# Altium footprint library 6-Connectors-2.PcbLib: 57 footprints (part 3 of 7)
Each footprint in its own frame and in the unit in brackets; x right, y up, seen from the top. Pads: shape width x height; smd on the part's side, far side on the other; paste and mask are expansions set on the pad; w line width, h text height; cw(c..) or ccw(c..) is an arc to the next point about the centre after c.
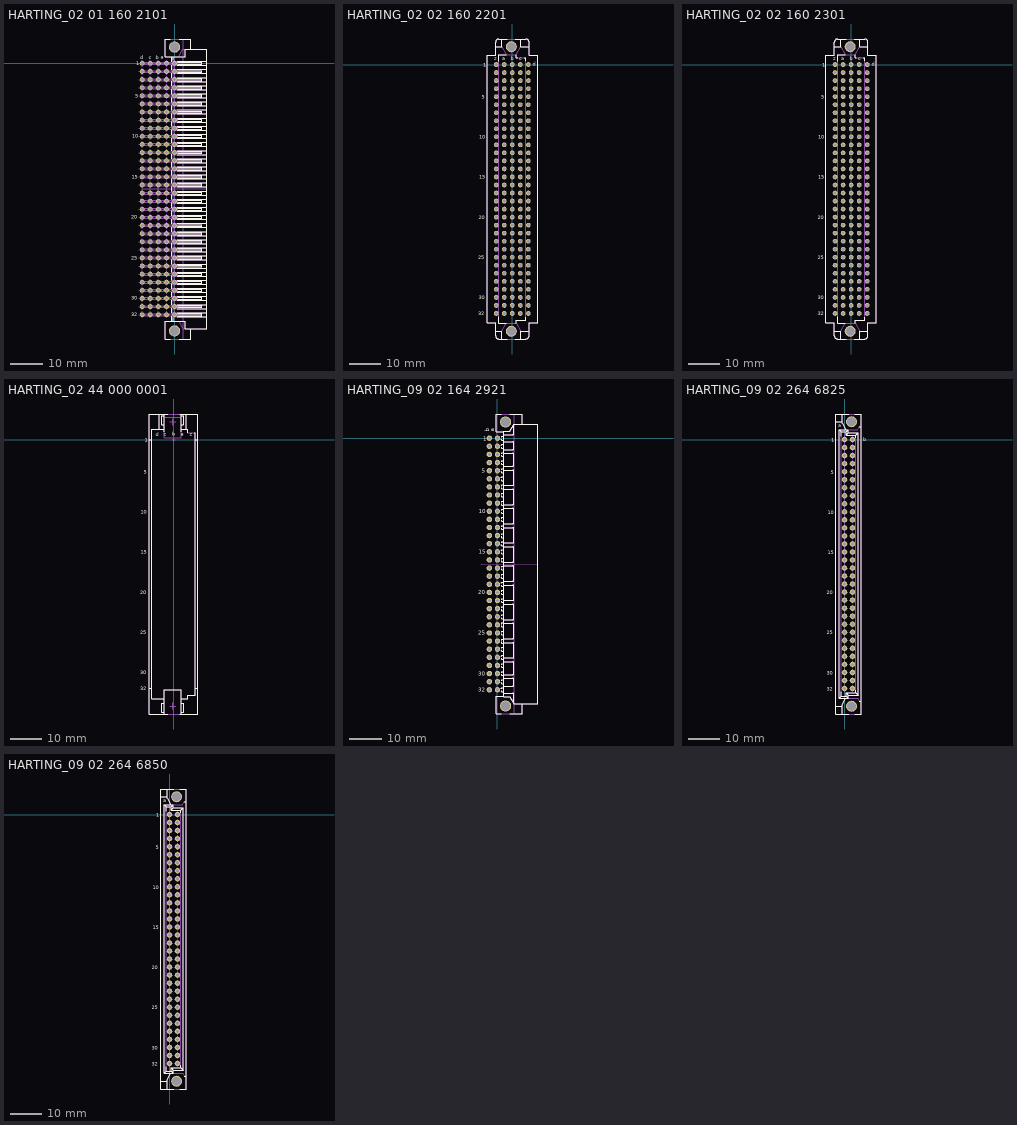
[diagram p2: the footprints below, top view; thin cyan lines are the x and y axes]

## HARTING_02 01 160 2101 [mm] "PCB connector, DIN 41612, har-bus 64, 160 poles, Angled solder pins, 3.0 mm, Male contacts, Four first mating contacts, Performance level 2 as per IEC 60603-2, Row pitch: 2.54 mm, Without fixing"
height 11.1
pads (162):
  round 1.5 hole 1: a1(-2.54,0) a2(-2.54,-2.54) a3(-2.54,-5.08) a4(-2.54,-7.62) a5(-2.54,-10.16) a6(-2.54,-12.7) a7(-2.54,-15.24) a8(-2.54,-17.78) a9(-2.54,-20.32) a10(-2.54,-22.86) a11(-2.54,-25.4) a12(-2.54,-27.94) a13(-2.54,-30.48) a14(-2.54,-33.02) a15(-2.54,-35.56) a16(-2.54,-38.1) a17(-2.54,-40.64) a18(-2.54,-43.18) a19(-2.54,-45.72) a20(-2.54,-48.26) a21(-2.54,-50.8) a22(-2.54,-53.34) a23(-2.54,-55.88) a24(-2.54,-58.42) a25(-2.54,-60.96) a26(-2.54,-63.5) a27(-2.54,-66.04) a28(-2.54,-68.58) a29(-2.54,-71.12) a30(-2.54,-73.66) a31(-2.54,-76.2) a32(-2.54,-78.74) b1(-5.08,0) b2(-5.08,-2.54) b3(-5.08,-5.08) b4(-5.08,-7.62) b5(-5.08,-10.16) b6(-5.08,-12.7) b7(-5.08,-15.24) b8(-5.08,-17.78) b9(-5.08,-20.32) b10(-5.08,-22.86) b11(-5.08,-25.4) b12(-5.08,-27.94) b13(-5.08,-30.48) b14(-5.08,-33.02) b15(-5.08,-35.56) b16(-5.08,-38.1) b17(-5.08,-40.64) b18(-5.08,-43.18) b19(-5.08,-45.72) b20(-5.08,-48.26) b21(-5.08,-50.8) b22(-5.08,-53.34) b23(-5.08,-55.88) b24(-5.08,-58.42) b25(-5.08,-60.96) b26(-5.08,-63.5) b27(-5.08,-66.04) b28(-5.08,-68.58) b29(-5.08,-71.12) b30(-5.08,-73.66) b31(-5.08,-76.2) b32(-5.08,-78.74) c1(-7.62,0) c2(-7.62,-2.54) c3(-7.62,-5.08) c4(-7.62,-7.62) c5(-7.62,-10.16) c6(-7.62,-12.7) c7(-7.62,-15.24) c8(-7.62,-17.78) c9(-7.62,-20.32) c10(-7.62,-22.86) c11(-7.62,-25.4) c12(-7.62,-27.94) c13(-7.62,-30.48) c14(-7.62,-33.02) c15(-7.62,-35.56) c16(-7.62,-38.1) c17(-7.62,-40.64) c18(-7.62,-43.18) c19(-7.62,-45.72) c20(-7.62,-48.26) c21(-7.62,-50.8) c22(-7.62,-53.34) c23(-7.62,-55.88) c24(-7.62,-58.42) c25(-7.62,-60.96) c26(-7.62,-63.5) c27(-7.62,-66.04) c28(-7.62,-68.58) c29(-7.62,-71.12) c30(-7.62,-73.66) c31(-7.62,-76.2) c32(-7.62,-78.74) d1(-10.16,0) d2(-10.16,-2.54) d3(-10.16,-5.08) d4(-10.16,-7.62) d5(-10.16,-10.16) d6(-10.16,-12.7) d7(-10.16,-15.24) d8(-10.16,-17.78) d9(-10.16,-20.32) d10(-10.16,-22.86) d11(-10.16,-25.4) d12(-10.16,-27.94) d13(-10.16,-30.48) d14(-10.16,-33.02) d15(-10.16,-35.56) d16(-10.16,-38.1) d17(-10.16,-40.64) d18(-10.16,-43.18) d19(-10.16,-45.72) d20(-10.16,-48.26) d21(-10.16,-50.8) d22(-10.16,-53.34) d23(-10.16,-55.88) d24(-10.16,-58.42) d25(-10.16,-60.96) d26(-10.16,-63.5) d27(-10.16,-66.04) d28(-10.16,-68.58) d29(-10.16,-71.12) d30(-10.16,-73.66) d31(-10.16,-76.2) d32(-10.16,-78.74) z1(0,0) z2(0,-2.54) z3(0,-5.08) z4(0,-7.62) z5(0,-10.16) z6(0,-12.7) z7(0,-15.24) z8(0,-17.78) z9(0,-20.32) z10(0,-22.86) z11(0,-25.4) z12(0,-27.94) z13(0,-30.48) z14(0,-33.02) z15(0,-35.56) z16(0,-38.1) z17(0,-40.64) z18(0,-43.18) z19(0,-45.72) z20(0,-48.26) z21(0,-50.8) z22(0,-53.34) z23(0,-55.88) z24(0,-58.42) z25(0,-60.96) z26(0,-63.5) z27(0,-66.04) z28(0,-68.58) z29(0,-71.12) z30(0,-73.66) z31(0,-76.2) z32(0,-78.74)
  round 3.5 / inner round 3.5 / far side round 5.1 hole 2.8: MTG1(0,5.08) MTG2(0,-83.82)
Top Overlay:
  drawing of 219 lines, arcs and shapes, not listed
  text "c" at -8.053,1.342 h1.2
  text "b" at -5.961,1.342 h1.2
  text "a" at -4.321,1.392 h1.2
  text "d" at -10.72,1.342 h1.2
  text "30" at -13.555,-73.03 h1.2
  text "25" at -13.62,-61.545 h1.2
  text "20" at -13.555,-48.77 h1.2
  text "15" at -13.375,-36.11 h1.2
  text "10" at -13.325,-23.385 h1.2
  text "5" at -12.405,-10.725 h1.2
  text "32" at -13.62,-79.32 h1.2
  text "1" at -12.05,-0.595 h1.2
Mechanical 8:
  drawing of 650 lines, arcs and shapes, not listed
  text "PCB" at 2.54,-41.275 h1.5
Mechanical 14:
  drawing of 308 lines, arcs and shapes, not listed
  text "z" at -0.127,1.067 h1.2
  text "d" at -10.72,1.342 h1.2
  text "a" at -4.321,1.392 h1.2
  text "b" at -5.961,1.342 h1.2
  text "c" at -8.053,1.342 h1.2
  text "30" at -13.555,-73.03 h1.2
  text "25" at -13.62,-61.545 h1.2
  text "20" at -13.555,-48.77 h1.2
  text "15" at -13.375,-36.11 h1.2
  text "10" at -13.325,-23.385 h1.2
  text "5" at -12.405,-10.725 h1.2
  text "32" at -13.62,-79.32 h1.2
  text "1" at -12.05,-0.595 h1.2
3D body "v160-080.stp": height 0.02, standoff -1.65, extent -0.8,-79.54 0.8,-77.94
3D body "v160-080.stp": height 0.02, standoff -1.65, extent -3.34,-79.54 -1.74,-77.94
3D body "v160-080.stp": height 0.02, standoff -1.65, extent -5.88,-79.54 -4.28,-77.94
3D body "v160-080.stp": height 0.02, standoff -1.65, extent -8.42,-79.54 -6.82,-77.94
3D body "v160-080.stp": height 0.02, standoff -1.65, extent -10.96,-79.54 -9.36,-77.94
3D body "v160-080.stp": height 0.02, standoff -1.65, extent -0.8,-77 0.8,-75.4
3D body "v160-080.stp": height 0.02, standoff -1.65, extent -3.34,-77 -1.74,-75.4
3D body "v160-080.stp": height 0.02, standoff -1.65, extent -5.88,-77 -4.28,-75.4
3D body "v160-080.stp": height 0.02, standoff -1.65, extent -8.42,-77 -6.82,-75.4
3D body "v160-080.stp": height 0.02, standoff -1.65, extent -10.96,-77 -9.36,-75.4
3D body "v160-080.stp": height 0.02, standoff -1.65, extent -0.8,-74.46 0.8,-72.86
3D body "v160-080.stp": height 0.02, standoff -1.65, extent -3.34,-74.46 -1.74,-72.86
3D body "v160-080.stp": height 0.02, standoff -1.65, extent -5.88,-74.46 -4.28,-72.86
3D body "v160-080.stp": height 0.02, standoff -1.65, extent -8.42,-74.46 -6.82,-72.86
3D body "v160-080.stp": height 0.02, standoff -1.65, extent -10.96,-74.46 -9.36,-72.86
3D body "v160-080.stp": height 0.02, standoff -1.65, extent -0.8,-71.92 0.8,-70.32
3D body "v160-080.stp": height 0.02, standoff -1.65, extent -3.34,-71.92 -1.74,-70.32
3D body "v160-080.stp": height 0.02, standoff -1.65, extent -5.88,-71.92 -4.28,-70.32
3D body "v160-080.stp": height 0.02, standoff -1.65, extent -8.42,-71.92 -6.82,-70.32
3D body "v160-080.stp": height 0.02, standoff -1.65, extent -10.96,-71.92 -9.36,-70.32
3D body "v160-080.stp": height 0.02, standoff -1.65, extent -0.8,-69.38 0.8,-67.78
3D body "v160-080.stp": height 0.02, standoff -1.65, extent -3.34,-69.38 -1.74,-67.78
3D body "v160-080.stp": height 0.02, standoff -1.65, extent -5.88,-69.38 -4.28,-67.78
3D body "v160-080.stp": height 0.02, standoff -1.65, extent -8.42,-69.38 -6.82,-67.78
3D body "v160-080.stp": height 0.02, standoff -1.65, extent -10.96,-69.38 -9.36,-67.78
3D body "v160-080.stp": height 0.02, standoff -1.65, extent -0.8,-66.84 0.8,-65.24
3D body "v160-080.stp": height 0.02, standoff -1.65, extent -3.34,-66.84 -1.74,-65.24
3D body "v160-080.stp": height 0.02, standoff -1.65, extent -5.88,-66.84 -4.28,-65.24
3D body "v160-080.stp": height 0.02, standoff -1.65, extent -8.42,-66.84 -6.82,-65.24
3D body "v160-080.stp": height 0.02, standoff -1.65, extent -10.96,-66.84 -9.36,-65.24
3D body "v160-080.stp": height 0.02, standoff -1.65, extent -0.8,-64.3 0.8,-62.7
3D body "v160-080.stp": height 0.02, standoff -1.65, extent -3.34,-64.3 -1.74,-62.7
3D body "v160-080.stp": height 0.02, standoff -1.65, extent -5.88,-64.3 -4.28,-62.7
3D body "v160-080.stp": height 0.02, standoff -1.65, extent -8.42,-64.3 -6.82,-62.7
3D body "v160-080.stp": height 0.02, standoff -1.65, extent -10.96,-64.3 -9.36,-62.7
3D body "v160-080.stp": height 0.02, standoff -1.65, extent -0.8,-61.76 0.8,-60.16
3D body "v160-080.stp": height 0.02, standoff -1.65, extent -3.34,-61.76 -1.74,-60.16
3D body "v160-080.stp": height 0.02, standoff -1.65, extent -5.88,-61.76 -4.28,-60.16
3D body "v160-080.stp": height 0.02, standoff -1.65, extent -8.42,-61.76 -6.82,-60.16
3D body "v160-080.stp": height 0.02, standoff -1.65, extent -10.96,-61.76 -9.36,-60.16
3D body "v160-080.stp": height 0.02, standoff -1.65, extent -0.8,-59.22 0.8,-57.62
3D body "v160-080.stp": height 0.02, standoff -1.65, extent -3.34,-59.22 -1.74,-57.62
3D body "v160-080.stp": height 0.02, standoff -1.65, extent -5.88,-59.22 -4.28,-57.62
3D body "v160-080.stp": height 0.02, standoff -1.65, extent -8.42,-59.22 -6.82,-57.62
3D body "v160-080.stp": height 0.02, standoff -1.65, extent -10.96,-59.22 -9.36,-57.62
3D body "v160-080.stp": height 0.02, standoff -1.65, extent -0.8,-56.68 0.8,-55.08
3D body "v160-080.stp": height 0.02, standoff -1.65, extent -3.34,-56.68 -1.74,-55.08
3D body "v160-080.stp": height 0.02, standoff -1.65, extent -5.88,-56.68 -4.28,-55.08
3D body "v160-080.stp": height 0.02, standoff -1.65, extent -8.42,-56.68 -6.82,-55.08
3D body "v160-080.stp": height 0.02, standoff -1.65, extent -10.96,-56.68 -9.36,-55.08
3D body "v160-080.stp": height 0.02, standoff -1.65, extent -0.8,-54.14 0.8,-52.54
3D body "v160-080.stp": height 0.02, standoff -1.65, extent -3.34,-54.14 -1.74,-52.54
3D body "v160-080.stp": height 0.02, standoff -1.65, extent -5.88,-54.14 -4.28,-52.54
3D body "v160-080.stp": height 0.02, standoff -1.65, extent -8.42,-54.14 -6.82,-52.54
3D body "v160-080.stp": height 0.02, standoff -1.65, extent -10.96,-54.14 -9.36,-52.54
3D body "v160-080.stp": height 0.02, standoff -1.65, extent -0.8,-51.6 0.8,-50
3D body "v160-080.stp": height 0.02, standoff -1.65, extent -3.34,-51.6 -1.74,-50
3D body "v160-080.stp": height 0.02, standoff -1.65, extent -5.88,-51.6 -4.28,-50
3D body "v160-080.stp": height 0.02, standoff -1.65, extent -8.42,-51.6 -6.82,-50
3D body "v160-080.stp": height 0.02, standoff -1.65, extent -10.96,-51.6 -9.36,-50
3D body "v160-080.stp": height 0.02, standoff -1.65, extent -0.8,-49.06 0.8,-47.46
3D body "v160-080.stp": height 0.02, standoff -1.65, extent -3.34,-49.06 -1.74,-47.46
3D body "v160-080.stp": height 0.02, standoff -1.65, extent -5.88,-49.06 -4.28,-47.46
3D body "v160-080.stp": height 0.02, standoff -1.65, extent -8.42,-49.06 -6.82,-47.46
3D body "v160-080.stp": height 0.02, standoff -1.65, extent -10.96,-49.06 -9.36,-47.46
3D body "v160-080.stp": height 0.02, standoff -1.65, extent -0.8,-46.52 0.8,-44.92
3D body "v160-080.stp": height 0.02, standoff -1.65, extent -3.34,-46.52 -1.74,-44.92
3D body "v160-080.stp": height 0.02, standoff -1.65, extent -5.88,-46.52 -4.28,-44.92
3D body "v160-080.stp": height 0.02, standoff -1.65, extent -8.42,-46.52 -6.82,-44.92
3D body "v160-080.stp": height 0.02, standoff -1.65, extent -10.96,-46.52 -9.36,-44.92
3D body "v160-080.stp": height 0.02, standoff -1.65, extent -0.8,-43.98 0.8,-42.38
3D body "v160-080.stp": height 0.02, standoff -1.65, extent -3.34,-43.98 -1.74,-42.38
3D body "v160-080.stp": height 0.02, standoff -1.65, extent -5.88,-43.98 -4.28,-42.38
3D body "v160-080.stp": height 0.02, standoff -1.65, extent -8.42,-43.98 -6.82,-42.38
3D body "v160-080.stp": height 0.02, standoff -1.65, extent -10.96,-43.98 -9.36,-42.38
3D body "v160-080.stp": height 0.02, standoff -1.65, extent -0.8,-41.44 0.8,-39.84
3D body "v160-080.stp": height 0.02, standoff -1.65, extent -3.34,-41.44 -1.74,-39.84
3D body "v160-080.stp": height 0.02, standoff -1.65, extent -5.88,-41.44 -4.28,-39.84
3D body "v160-080.stp": height 0.02, standoff -1.65, extent -8.42,-41.44 -6.82,-39.84
3D body "v160-080.stp": height 0.02, standoff -1.65, extent -10.96,-41.44 -9.36,-39.84
3D body "v160-080.stp": height 0.02, standoff -1.65, extent -0.8,-38.9 0.8,-37.3
3D body "v160-080.stp": height 0.02, standoff -1.65, extent -3.34,-38.9 -1.74,-37.3
3D body "v160-080.stp": height 0.02, standoff -1.65, extent -5.88,-38.9 -4.28,-37.3
3D body "v160-080.stp": height 0.02, standoff -1.65, extent -8.42,-38.9 -6.82,-37.3
3D body "v160-080.stp": height 0.02, standoff -1.65, extent -10.96,-38.9 -9.36,-37.3
3D body "v160-080.stp": height 0.02, standoff -1.65, extent -0.8,-36.36 0.8,-34.76
3D body "v160-080.stp": height 0.02, standoff -1.65, extent -3.34,-36.36 -1.74,-34.76
3D body "v160-080.stp": height 0.02, standoff -1.65, extent -5.88,-36.36 -4.28,-34.76
3D body "v160-080.stp": height 0.02, standoff -1.65, extent -8.42,-36.36 -6.82,-34.76
3D body "v160-080.stp": height 0.02, standoff -1.65, extent -10.96,-36.36 -9.36,-34.76
3D body "v160-080.stp": height 0.02, standoff -1.65, extent -0.8,-33.82 0.8,-32.22
3D body "v160-080.stp": height 0.02, standoff -1.65, extent -3.34,-33.82 -1.74,-32.22
3D body "v160-080.stp": height 0.02, standoff -1.65, extent -5.88,-33.82 -4.28,-32.22
3D body "v160-080.stp": height 0.02, standoff -1.65, extent -8.42,-33.82 -6.82,-32.22
3D body "v160-080.stp": height 0.02, standoff -1.65, extent -10.96,-33.82 -9.36,-32.22
3D body "v160-080.stp": height 0.02, standoff -1.65, extent -0.8,-31.28 0.8,-29.68
3D body "v160-080.stp": height 0.02, standoff -1.65, extent -3.34,-31.28 -1.74,-29.68
3D body "v160-080.stp": height 0.02, standoff -1.65, extent -5.88,-31.28 -4.28,-29.68
3D body "v160-080.stp": height 0.02, standoff -1.65, extent -8.42,-31.28 -6.82,-29.68
3D body "v160-080.stp": height 0.02, standoff -1.65, extent -10.96,-31.28 -9.36,-29.68
3D body "v160-080.stp": height 0.02, standoff -1.65, extent -0.8,-28.74 0.8,-27.14
3D body "v160-080.stp": height 0.02, standoff -1.65, extent -3.34,-28.74 -1.74,-27.14
3D body "v160-080.stp": height 0.02, standoff -1.65, extent -5.88,-28.74 -4.28,-27.14
3D body "v160-080.stp": height 0.02, standoff -1.65, extent -8.42,-28.74 -6.82,-27.14
3D body "v160-080.stp": height 0.02, standoff -1.65, extent -10.96,-28.74 -9.36,-27.14
3D body "v160-080.stp": height 0.02, standoff -1.65, extent -0.8,-26.2 0.8,-24.6
3D body "v160-080.stp": height 0.02, standoff -1.65, extent -3.34,-26.2 -1.74,-24.6
3D body "v160-080.stp": height 0.02, standoff -1.65, extent -5.88,-26.2 -4.28,-24.6
3D body "v160-080.stp": height 0.02, standoff -1.65, extent -8.42,-26.2 -6.82,-24.6
3D body "v160-080.stp": height 0.02, standoff -1.65, extent -10.96,-26.2 -9.36,-24.6
3D body "v160-080.stp": height 0.02, standoff -1.65, extent -0.8,-23.66 0.8,-22.06
3D body "v160-080.stp": height 0.02, standoff -1.65, extent -3.34,-23.66 -1.74,-22.06
3D body "v160-080.stp": height 0.02, standoff -1.65, extent -5.88,-23.66 -4.28,-22.06
3D body "v160-080.stp": height 0.02, standoff -1.65, extent -8.42,-23.66 -6.82,-22.06
3D body "v160-080.stp": height 0.02, standoff -1.65, extent -10.96,-23.66 -9.36,-22.06
3D body "v160-080.stp": height 0.02, standoff -1.65, extent -0.8,-21.12 0.8,-19.52
3D body "v160-080.stp": height 0.02, standoff -1.65, extent -3.34,-21.12 -1.74,-19.52
3D body "v160-080.stp": height 0.02, standoff -1.65, extent -5.88,-21.12 -4.28,-19.52
3D body "v160-080.stp": height 0.02, standoff -1.65, extent -8.42,-21.12 -6.82,-19.52
3D body "v160-080.stp": height 0.02, standoff -1.65, extent -10.96,-21.12 -9.36,-19.52
3D body "v160-080.stp": height 0.02, standoff -1.65, extent -0.8,-18.58 0.8,-16.98
3D body "v160-080.stp": height 0.02, standoff -1.65, extent -3.34,-18.58 -1.74,-16.98
3D body "v160-080.stp": height 0.02, standoff -1.65, extent -5.88,-18.58 -4.28,-16.98
3D body "v160-080.stp": height 0.02, standoff -1.65, extent -8.42,-18.58 -6.82,-16.98
3D body "v160-080.stp": height 0.02, standoff -1.65, extent -10.96,-18.58 -9.36,-16.98
3D body "v160-080.stp": height 0.02, standoff -1.65, extent -0.8,-16.04 0.8,-14.44
3D body "v160-080.stp": height 0.02, standoff -1.65, extent -3.34,-16.04 -1.74,-14.44
3D body "v160-080.stp": height 0.02, standoff -1.65, extent -5.88,-16.04 -4.28,-14.44
3D body "v160-080.stp": height 0.02, standoff -1.65, extent -8.42,-16.04 -6.82,-14.44
3D body "v160-080.stp": height 0.02, standoff -1.65, extent -10.96,-16.04 -9.36,-14.44
3D body "v160-080.stp": height 0.02, standoff -1.65, extent -0.8,-13.5 0.8,-11.9
3D body "v160-080.stp": height 0.02, standoff -1.65, extent -3.34,-13.5 -1.74,-11.9
3D body "v160-080.stp": height 0.02, standoff -1.65, extent -5.88,-13.5 -4.28,-11.9
3D body "v160-080.stp": height 0.02, standoff -1.65, extent -8.42,-13.5 -6.82,-11.9
3D body "v160-080.stp": height 0.02, standoff -1.65, extent -10.96,-13.5 -9.36,-11.9
3D body "v160-080.stp": height 0.02, standoff -1.65, extent -0.8,-10.96 0.8,-9.36
3D body "v160-080.stp": height 0.02, standoff -1.65, extent -3.34,-10.96 -1.74,-9.36
3D body "v160-080.stp": height 0.02, standoff -1.65, extent -5.88,-10.96 -4.28,-9.36
3D body "v160-080.stp": height 0.02, standoff -1.65, extent -8.42,-10.96 -6.82,-9.36
3D body "v160-080.stp": height 0.02, standoff -1.65, extent -10.96,-10.96 -9.36,-9.36
3D body "v160-080.stp": height 0.02, standoff -1.65, extent -0.8,-8.42 0.8,-6.82
3D body "v160-080.stp": height 0.02, standoff -1.65, extent -3.34,-8.42 -1.74,-6.82
3D body "v160-080.stp": height 0.02, standoff -1.65, extent -5.88,-8.42 -4.28,-6.82
3D body "v160-080.stp": height 0.02, standoff -1.65, extent -8.42,-8.42 -6.82,-6.82
3D body "v160-080.stp": height 0.02, standoff -1.65, extent -10.96,-8.42 -9.36,-6.82
3D body "v160-080.stp": height 0.02, standoff -1.65, extent -0.8,-5.88 0.8,-4.28
3D body "v160-080.stp": height 0.02, standoff -1.65, extent -3.34,-5.88 -1.74,-4.28
3D body "v160-080.stp": height 0.02, standoff -1.65, extent -5.88,-5.88 -4.28,-4.28
3D body "v160-080.stp": height 0.02, standoff -1.65, extent -8.42,-5.88 -6.82,-4.28
3D body "v160-080.stp": height 0.02, standoff -1.65, extent -10.96,-5.88 -9.36,-4.28
3D body "v160-080.stp": height 0.02, standoff -1.65, extent -0.8,-3.34 0.8,-1.74
3D body "v160-080.stp": height 0.02, standoff -1.65, extent -3.34,-3.34 -1.74,-1.74
3D body "v160-080.stp": height 0.02, standoff -1.65, extent -5.88,-3.34 -4.28,-1.74
3D body "v160-080.stp": height 0.02, standoff -1.65, extent -8.42,-3.34 -6.82,-1.74
3D body "v160-080.stp": height 0.02, standoff -1.65, extent -10.96,-3.34 -9.36,-1.74
3D body "v160-080.stp": height 0.02, standoff -1.65, extent -0.8,-0.8 0.8,0.8
3D body "v160-080.stp": height 0.02, standoff -1.65, extent -3.34,-0.8 -1.74,0.8
3D body "v160-080.stp": height 0.02, standoff -1.65, extent -5.88,-0.8 -4.28,0.8
3D body "v160-080.stp": height 0.02, standoff -1.65, extent -8.42,-0.8 -6.82,0.8
3D body "v160-080.stp": height 0.02, standoff -1.65, extent -10.96,-0.8 -9.36,0.8
3D body "HARTING_02 01 160 2101.stp": height 9.55, standoff -3, extent -10.46,-86.37 10.1,7.63

## HARTING_02 02 160 2201 [mm] "Backplane Connector; Har-bus 64, Thru-Hole; Rows z+a+b+c+d, Press-in 160 Female Contacts"
height 11.6
pads (162):
  round 1.5 hole 1: a1(-2.54,0) a2(-2.54,-2.54) a3(-2.54,-5.08) a4(-2.54,-7.62) a5(-2.54,-10.16) a6(-2.54,-12.7) a7(-2.54,-15.24) a8(-2.54,-17.78) a9(-2.54,-20.32) a10(-2.54,-22.86) a11(-2.54,-25.4) a12(-2.54,-27.94) a13(-2.54,-30.48) a14(-2.54,-33.02) a15(-2.54,-35.56) a16(-2.54,-38.1) a17(-2.54,-40.64) a18(-2.54,-43.18) a19(-2.54,-45.72) a20(-2.54,-48.26) a21(-2.54,-50.8) a22(-2.54,-53.34) a23(-2.54,-55.88) a24(-2.54,-58.42) a25(-2.54,-60.96) a26(-2.54,-63.5) a27(-2.54,-66.04) a28(-2.54,-68.58) a29(-2.54,-71.12) a30(-2.54,-73.66) a31(-2.54,-76.2) a32(-2.54,-78.74) b1(0,0) b2(0,-2.54) b3(0,-5.08) b4(0,-7.62) b5(0,-10.16) b6(0,-12.7) b7(0,-15.24) b8(0,-17.78) b9(0,-20.32) b10(0,-22.86) b11(0,-25.4) b12(0,-27.94) b13(0,-30.48) b14(0,-33.02) b15(0,-35.56) b16(0,-38.1) b17(0,-40.64) b18(0,-43.18) b19(0,-45.72) b20(0,-48.26) b21(0,-50.8) b22(0,-53.34) b23(0,-55.88) b24(0,-58.42) b25(0,-60.96) b26(0,-63.5) b27(0,-66.04) b28(0,-68.58) b29(0,-71.12) b30(0,-73.66) b31(0,-76.2) b32(0,-78.74) c1(2.54,0) c2(2.54,-2.54) c3(2.54,-5.08) c4(2.54,-7.62) c5(2.54,-10.16) c6(2.54,-12.7) c7(2.54,-15.24) c8(2.54,-17.78) c9(2.54,-20.32) c10(2.54,-22.86) c11(2.54,-25.4) c12(2.54,-27.94) c13(2.54,-30.48) c14(2.54,-33.02) c15(2.54,-35.56) c16(2.54,-38.1) c17(2.54,-40.64) c18(2.54,-43.18) c19(2.54,-45.72) c20(2.54,-48.26) c21(2.54,-50.8) c22(2.54,-53.34) c23(2.54,-55.88) c24(2.54,-58.42) c25(2.54,-60.96) c26(2.54,-63.5) c27(2.54,-66.04) c28(2.54,-68.58) c29(2.54,-71.12) c30(2.54,-73.66) c31(2.54,-76.2) c32(2.54,-78.74) d1(5.08,0) d2(5.08,-2.54) d3(5.08,-5.08) d4(5.08,-7.62) d5(5.08,-10.16) d6(5.08,-12.7) d7(5.08,-15.24) d8(5.08,-17.78) d9(5.08,-20.32) d10(5.08,-22.86) d11(5.08,-25.4) d12(5.08,-27.94) d13(5.08,-30.48) d14(5.08,-33.02) d15(5.08,-35.56) d16(5.08,-38.1) d17(5.08,-40.64) d18(5.08,-43.18) d19(5.08,-45.72) d20(5.08,-48.26) d21(5.08,-50.8) d22(5.08,-53.34) d23(5.08,-55.88) d24(5.08,-58.42) d25(5.08,-60.96) d26(5.08,-63.5) d27(5.08,-66.04) d28(5.08,-68.58) d29(5.08,-71.12) d30(5.08,-73.66) d31(5.08,-76.2) d32(5.08,-78.74) z1(-5.08,0) z2(-5.08,-2.54) z3(-5.08,-5.08) z4(-5.08,-7.62) z5(-5.08,-10.16) z6(-5.08,-12.7) z7(-5.08,-15.24) z8(-5.08,-17.78) z9(-5.08,-20.32) z10(-5.08,-22.86) z11(-5.08,-25.4) z12(-5.08,-27.94) z13(-5.08,-30.48) z14(-5.08,-33.02) z15(-5.08,-35.56) z16(-5.08,-38.1) z17(-5.08,-40.64) z18(-5.08,-43.18) z19(-5.08,-45.72) z20(-5.08,-48.26) z21(-5.08,-50.8) z22(-5.08,-53.34) z23(-5.08,-55.88) z24(-5.08,-58.42) z25(-5.08,-60.96) z26(-5.08,-63.5) z27(-5.08,-66.04) z28(-5.08,-68.58) z29(-5.08,-71.12) z30(-5.08,-73.66) z31(-5.08,-76.2) z32(-5.08,-78.74)
  round 3.5 / inner round 3.5 / far side round 5.1 hole 2.8: MTG1(-0.3,5.63) MTG2(-0.3,-84.37)
Top Overlay:
  lines w0.2: -5.3,-84.395 -3.3,-84.395 -3.3,-86.82 ; -5.3,5.655 -3.3,5.655 -3.3,8.08 ; -4.25,-79.85 -4.25,-81.87 -1.9,-81.87 ; -4.25,1.11 -4.25,3.13 -1.9,3.13 ; -1.6,-86.82 -3.325,-86.82 -4.3,-86.82 cw(c-4.3,-85.82) -5.3,-85.82 -5.3,-84.37 -5.3,-81.725 -8,-81.725 -8,2.985 -5.3,2.985 -5.3,5.63 -5.3,7.08 cw(c-4.3,7.08) -4.3,8.08 -3.325,8.08 -1.6,8.08 ; 1,-86.82 2.725,-86.82 4.3,-86.82 ccw(c4.3,-85.82) 5.3,-85.82 5.3,-84.37 5.3,-81.725 8,-81.725 8,2.985 5.3,2.985 5.3,5.655 2.7,5.655 2.7,8.08 ; 1,8.08 2.725,8.08 4.3,8.08 cw(c4.3,7.08) 5.3,7.08 5.3,5.63 ; 1.25,-81.87 1.25,-80.87 4.25,-80.87 4.25,-80.01 ; 1.25,3.13 1.25,2.13 1.69,2.13 ; 2.7,-86.82 2.7,-84.395 5.3,-84.395 ; 3.81,2.13 4.25,2.13 4.25,1.27
  text "d" at 6.475,-0.45 h1.2
  text "c" at 2.275,1.425 h1.2
  text "1" at -9.17,-0.675 h1.2
  text "z" at -5.725,1.375 h1.2
  text "a" at -3.14,1.39 h1.2
  text "b" at -0.425,1.4 h1.2
  text "32" at -10.7,-79.375 h1.2
  text "5" at -9.625,-10.795 h1.2
  text "10" at -10.495,-23.485 h1.2
  text "15" at -10.495,-36.185 h1.2
  text "20" at -10.675,-48.875 h1.2
  text "25" at -10.725,-61.6 h1.2
  text "30" at -10.675,-74.3 h1.2
Mechanical 8:
  lines w0.1: -1.3,-84.37 -0.3,-84.37 ; -1.3,5.63 -0.3,5.63 ; -0.3,-85.37 -0.3,-84.37 ; -0.3,-83.37 -0.3,-84.37 ; -0.3,4.63 -0.3,5.63 ; -0.3,6.63 -0.3,5.63 ; 0.7,-84.37 -0.3,-84.37 ; 0.7,5.63 -0.3,5.63
Mechanical 14:
  circle w0.1: c-0.3,-84.37 r1.425
  circle w0.1: c-0.3,5.63 r1.425
  lines w0.1: -5.3,-84.395 -3.3,-84.395 ; -5.3,5.655 -3.3,5.655 ; -3.3,-86.82 -3.3,-84.395 ; -3.3,8.08 -3.3,5.655 ; -1.85,-81.87 -3.3,-84.395 ; -1.85,3.13 -3.3,5.655 ; -1.817,-81.87 1.217,-81.87 ; -1.817,3.13 1.217,3.13 ; 2.7,-86.82 2.7,-84.395 ; 2.7,8.08 2.7,5.655 ; 5.3,-84.395 2.7,-84.395 ; 5.3,5.63 5.3,7.08 ccw(c4.3,7.08) 4.3,8.08 2.725,8.08 -3.325,8.08 -4.3,8.08 ccw(c-4.3,7.08) -5.3,7.08 -5.3,5.63 -5.3,2.985 -8,2.985 -8,-81.725 -5.3,-81.725 -5.3,-84.37 -5.3,-85.82 ccw(c-4.3,-85.82) -4.3,-86.82 -3.325,-86.82 2.725,-86.82 4.3,-86.82 ccw(c4.3,-85.82) 5.3,-85.82 5.3,-84.37 5.3,-81.725 8,-81.725 8,2.985 5.3,2.985 5.3,5.655 2.7,5.655 ; 1.25,-81.87 2.7,-84.395 ; 1.25,-81.87 -4.25,-81.87 -4.25,3.13 1.25,3.13 ; 1.25,-81.87 1.25,-80.87 4.25,-80.87 4.25,2.13 1.25,2.13 1.25,3.13 ; 1.25,3.13 2.7,5.655